# Altium footprint library ZLS_Lib.PcbLib: 157 footprints (part 10 of 10)
Each footprint in its own frame and in the unit in brackets; x right, y up, seen from the top. Pads: shape width x height; smd on the part's side, far side on the other; paste and mask are expansions set on the pad; w line width, h text height; cw(c..) or ccw(c..) is an arc to the next point about the centre after c.
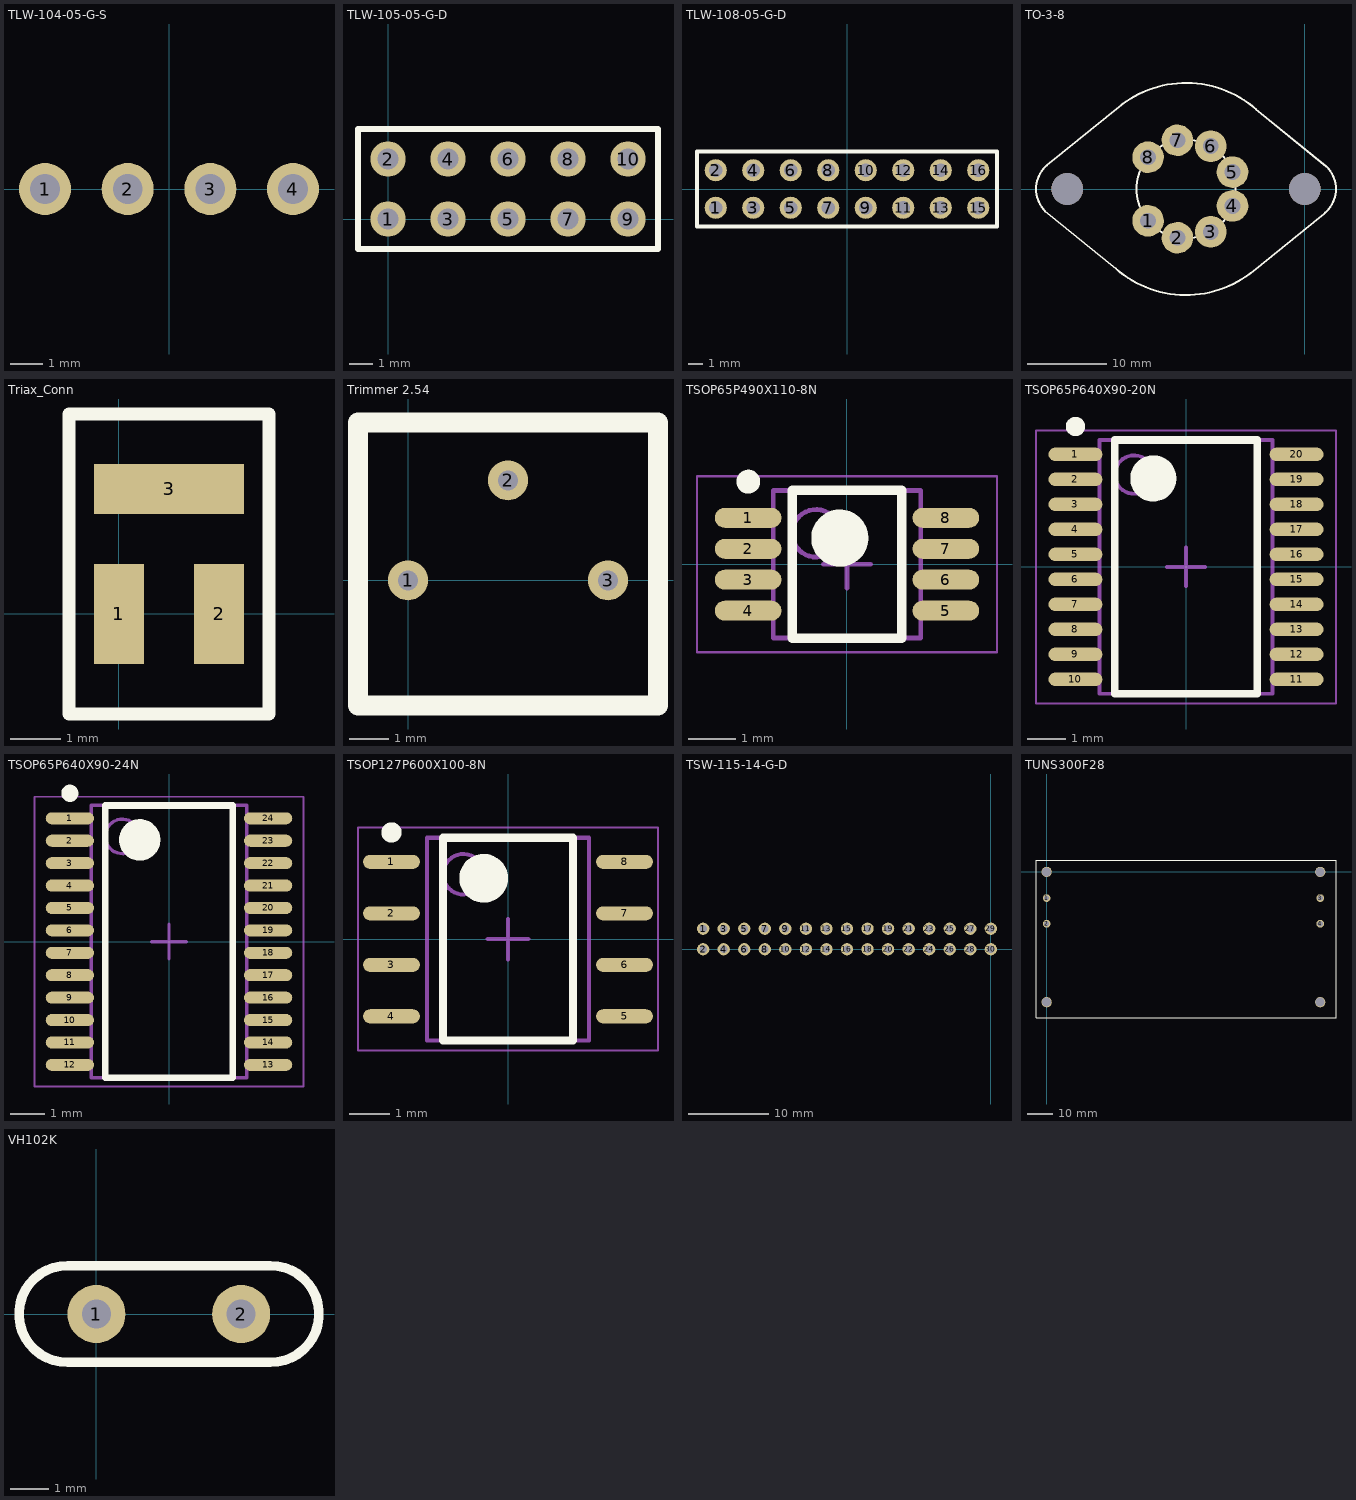
[diagram p9: the footprints below, top view; thin cyan lines are the x and y axes]

## TLW-104-05-G-S [mm]
pads (4):
  round 1.6 hole 0.91: 1(-3.81,0) 2(-1.27,0) 3(1.27,0) 4(3.81,0)
3D body "_TLW_04_05_S_4.sldprt": height 2.51, standoff -6, extent -4.254,-0.444 4.255,0.445
3D body "_TLW_104_05_G_S0_335_terminal_2.sldprt": height 1.52, standoff 0, extent -5.08,-1.27 5.08,1.219

## TLW-105-05-G-D [mm]
pads (10):
  round 1.5 hole 0.91: 1(0,0) 2(0,2.54) 3(2.54,0) 4(2.54,2.54) 5(5.08,0) 6(5.08,2.54) 7(7.62,0) 8(7.62,2.54) 9(10.16,0) 10(10.16,2.54)
Top Overlay:
  lines w0.254: -1.27,-1.27 -1.27,3.81 11.43,3.81 11.43,-1.27 -1.27,-1.27
3D body "_TLW_05_05_D_4.sldprt": height 6.35, standoff -2.16, extent -0.445,-0.508 10.605,2.921
3D body "_TLW_105_05_G_D0_335_terminal_2.sldprt": height 1.52, standoff 0, extent -1.27,-1.308 11.43,3.721

## TLW-108-05-G-D [mm]
pads (16):
  round 1.5 hole 0.91: 1(-8.89,-1.27) 2(-8.89,1.27) 3(-6.35,-1.27) 4(-6.35,1.27) 5(-3.81,-1.27) 6(-3.81,1.27) 7(-1.27,-1.27) 8(-1.27,1.27) 9(1.27,-1.27) 10(1.27,1.27) 11(3.81,-1.27) 12(3.81,1.27) 13(6.35,-1.27) 14(6.35,1.27) 15(8.89,-1.27) 16(8.89,1.27)
Top Overlay:
  lines w0.254: -10.16,-2.54 -10.16,2.54 10.16,2.54 10.16,-2.54 -10.16,-2.54
3D body "_TLW_08_05_D_4.sldprt": height 6.35, standoff -2.16, extent -9.335,-1.715 9.335,1.715
3D body "_TLW_108_05_G_D0_335_terminal_2.sldprt": height 1.52, standoff 0, extent -10.16,-2.515 10.16,2.515

## TO-3-8 [mm]
height 9
pads (10):
  round 4 hole 2: 1(-19.788,-4.017) 2(-16.085,-6.155) 3(-11.875,-5.413) 4(-9.127,-2.138) 5(-9.127,2.138) 6(-11.875,5.413) 7(-16.085,6.155) 8(-19.788,4.017)
  round 4 hole 4: ""(-30,0) ""(0,0)
Top Overlay:
  circle w0.254: c-15,0 r6.25
  lines w0.254: -32.81,-2.814 -23.843,-10.072 ccw(c-15,0) -6.877,-10.661 ; -32.793,-2.793 cw(c-30,0) -32.539,3.026 ; -32.567,2.992 -23.123,10.661 ; -23.123,10.661 cw(c-15,0) -6.157,10.072 ; -6.825,-10.625 2.478,-3.119 ; -6.175,10.075 2.739,2.85 ; 2.539,-3.026 ccw(c0,0) 2.793,2.793

## Triax_Conn [mm] "Triaxial pads for Conning Tower"
pads (3):
  rect 1x2 smd: 1(0,0) 2(2,0)
  rect 3x1 smd: 3(1,2.5)
Top Overlay:
  lines w0.254: -1,-2 -1,4 3,4 3,-2 -1,-2

## Trimmer 2.54 [mil]
pads (3):
  round 40 hole 20: 1(0,0) 2(100,100) 3(200,0)
Top Overlay:
  lines w20: -50,-125 -50,157.6 -36.2,157.6 -20.6,157.6 39.4,157.6 250,157.6 250,-50 250,-125 -50,-125
3D body: height 175, standoff 0, extent -60,-125.98 260,167.6
3D body: height 175, standoff 0, extent -49.98,-122.05 249.98,157.58
3D body: height 175, standoff 0, extent -60,-119.09 260,167.6
3D body: height 175, standoff 0, extent -50.2,-125 248.03,157.6
3D body: height 175, standoff 100, extent -15.03,167.08 13.78,199.8

## TSOP65P490X110-8N [mm] "TSOP, 8-Leads, Body 3.00x3.00mm, Pitch 0.65mm, IPC Medium Density"
height 1.1
pads (8):
  oval 1.4x0.42 smd: 1(-2.075,0.975) 2(-2.075,0.325) 3(-2.075,-0.325) 4(-2.075,-0.975) 5(2.075,-0.975) 6(2.075,-0.325) 7(2.075,0.325) 8(2.075,0.975)
Top Overlay:
  circle w0.25: c-2.075,1.735 r0.125
  circle w0.6: c-0.15,0.55 r0.3
  lines w0.2: -1.15,-1.55 -1.15,1.55 1.15,1.55 1.15,-1.55 -1.15,-1.55
Mechanical 13:
  circle w0.1: c-0.65,0.65 r0.5
  lines w0.1: -1.55,-1.55 -1.55,1.55 1.55,1.55 1.55,-1.55 -1.55,-1.55
Mechanical 15:
  lines w0.05: -3.15,-1.85 -3.15,1.85 3.15,1.85 3.15,-1.85 -3.15,-1.85
  lines w0.1: -0.5,0 0.5,0 ; 0,-0.5 0,0.5
3D body "TSOP65P490X110-8N.step": height 1.1, standoff 0, extent -2.459,-1.55 2.459,1.55

## TSOP65P640X90-20N [mm] "TSOP, 20-Leads, Body 6.50x4.40mm, Pitch 0.65mm, IPC Medium Density"
height 0.9
pads (20):
  oval 1.4x0.35 smd: 1(-2.875,2.925) 2(-2.875,2.275) 3(-2.875,1.625) 4(-2.875,0.975) 5(-2.875,0.325) 6(-2.875,-0.325) 7(-2.875,-0.975) 8(-2.875,-1.625) 9(-2.875,-2.275) 10(-2.875,-2.925) 11(2.875,-2.925) 12(2.875,-2.275) 13(2.875,-1.625) 14(2.875,-0.975) 15(2.875,-0.325) 16(2.875,0.325) 17(2.875,0.975) 18(2.875,1.625) 19(2.875,2.275) 20(2.875,2.925)
Top Overlay:
  circle w0.6: c-0.85,2.3 r0.3
  circle w0.25: c-2.875,3.65 r0.125
  lines w0.2: -1.85,-3.3 1.85,-3.3 1.85,3.3 -1.85,3.3 -1.85,-3.3
Mechanical 13:
  circle w0.1: c-1.35,2.4 r0.5
  lines w0.1: -2.25,-3.3 2.25,-3.3 2.25,3.3 -2.25,3.3 -2.25,-3.3
Mechanical 15:
  lines w0.05: -3.9,-3.55 3.9,-3.55 3.9,3.55 -3.9,3.55 -3.9,-3.55
  lines w0.1: -0.5,0 0.5,0 ; 0,-0.5 0,0.5
3D body: height 0.9, standoff 0.1, extent -2.25,-3.3 2.25,3.3

## TSOP65P640X90-24N [mm] "TSOP, 24-Leads, Body 7.80x4.40mm, Pitch 0.65mm, IPC Medium Density"
height 0.9
pads (24):
  oval 1.4x0.35 smd mask+0.076: 1(-2.875,3.575) 2(-2.875,2.925) 3(-2.875,2.275) 4(-2.875,1.625) 5(-2.875,0.975) 6(-2.875,0.325) 7(-2.875,-0.325) 8(-2.875,-0.975) 9(-2.875,-1.625) 10(-2.875,-2.275) 11(-2.875,-2.925) 12(-2.875,-3.575) 13(2.875,-3.575) 14(2.875,-2.925) 15(2.875,-2.275) 16(2.875,-1.625) 17(2.875,-0.975) 18(2.875,-0.325) 19(2.875,0.325) 20(2.875,0.975) 22(2.875,2.275) 23(2.875,2.925) 24(2.875,3.575)
  oval 1.4x0.35 smd mask+0.102: 21(2.875,1.625)
Top Overlay:
  circle w0.25: c-2.875,4.3 r0.125
  circle w0.6: c-0.85,2.95 r0.3
  lines w0.2: -1.85,-3.95 -1.85,3.95 1.85,3.95 1.85,-3.95 -1.85,-3.95
Mechanical 13:
  circle w0.1: c-1.35,3.05 r0.5
  lines w0.1: -2.25,-3.95 -2.25,3.95 2.25,3.95 2.25,-3.95 -2.25,-3.95
Mechanical 15:
  lines w0.05: -3.9,-4.2 -3.9,4.2 3.9,4.2 3.9,-4.2 -3.9,-4.2
  lines w0.1: -0.5,0 0.5,0 ; 0,-0.5 0,0.5
3D body: height 0.9, standoff 0, extent -3.2,-3.95 3.2,3.95

## TSOP127P600X100-8N [mm] "TSOP, 8-Leads, Body 4.90x3.90mm, Pitch 1.27mm, IPC Medium Density"
height 1
pads (8):
  oval 1.4x0.35 smd: 1(-2.875,1.905) 2(-2.875,0.635) 3(-2.875,-0.635) 4(-2.875,-1.905) 5(2.875,-1.905) 6(2.875,-0.635) 7(2.875,0.635) 8(2.875,1.905)
Top Overlay:
  circle w0.25: c-2.875,2.63 r0.125
  circle w0.6: c-0.6,1.5 r0.3
  lines w0.2: -1.6,-2.5 -1.6,2.5 1.6,2.5 1.6,-2.5 -1.6,-2.5
Mechanical 13:
  circle w0.1: c-1.1,1.6 r0.5
  lines w0.1: -2,-2.5 -2,2.5 2,2.5 2,-2.5 -2,-2.5
Mechanical 15:
  lines w0.05: -3.7,-2.75 -3.7,2.75 3.7,2.75 3.7,-2.75 -3.7,-2.75
  lines w0.1: -0.5,0 0.5,0 ; 0,-0.5 0,0.5
3D body: height 1, standoff 0.1, extent -2,-2.5 2,2.5

## TSW-115-14-G-D [mil]
pads (30):
  round 60 hole 36.02: 1(-1400,100) 2(-1400,0) 3(-1300,100) 4(-1300,0) 5(-1200,100) 6(-1200,0) 7(-1100,100) 8(-1100,0) 9(-1000,100) 10(-1000,0) 11(-900,100) 12(-900,0) 13(-800,100) 14(-800,0) 15(-700,100) 16(-700,0) 17(-600,100) 18(-600,0) 19(-500,100) 20(-500,0) 21(-400,100) 22(-400,0) 23(-300,100) 24(-300,0) 25(-200,100) 26(-200,0) 27(-100,100) 28(-100,0) 29(0,100) 30(0,0)
3D body "_T_1S6_08_TSW_1_14_15_D_4.sldprt": height 118.11, standoff -411.89, extent -1417.5,-17.49 17.5,117.51
3D body "_TSW_115_14_G_D_body_2.sldprt": height -19.68, standoff -119.69, extent -1450,-50 50,150

## TUNS300F28 [mm] "AC-DC power supply 28V"
height 12.7
pads (8):
  round 3 hole 2: 1(0,-10.2) 2(0,-20.2) 3(106.7,-10.2) 4(106.7,-20.2)
  round 4 hole 3.5: ""(0,-50.8) ""(0,0) ""(106.7,-50.8) ""(106.7,0)
Top Overlay:
  lines w0.254: -4.15,-56.9 112.85,-56.9 112.85,4.6 -4.15,4.6 -4.15,-56.9
3D body: height 5, standoff 0, extent -4,-57 113,4.5

## VH102K [mil] "Hermetically Sealed High Precision Resistor"
height 429.92
pads (2):
  round 60 hole 30: 1(0,0) 2(149.61,0)
Top Overlay:
  lines w10: -29.75,-50 cw(c-30,0) -29.75,50 179.75,50 cw(c180,0) 179.75,-50 -29.75,-50